# Altium footprint library C210 Rev_D_221221a.PcbLib: 89 footprints (part 2 of 6)
Each footprint in its own frame and in the unit in brackets; x right, y up, seen from the top. Pads: shape width x height; smd on the part's side, far side on the other; paste and mask are expansions set on the pad; w line width, h text height; cw(c..) or ccw(c..) is an arc to the next point about the centre after c.
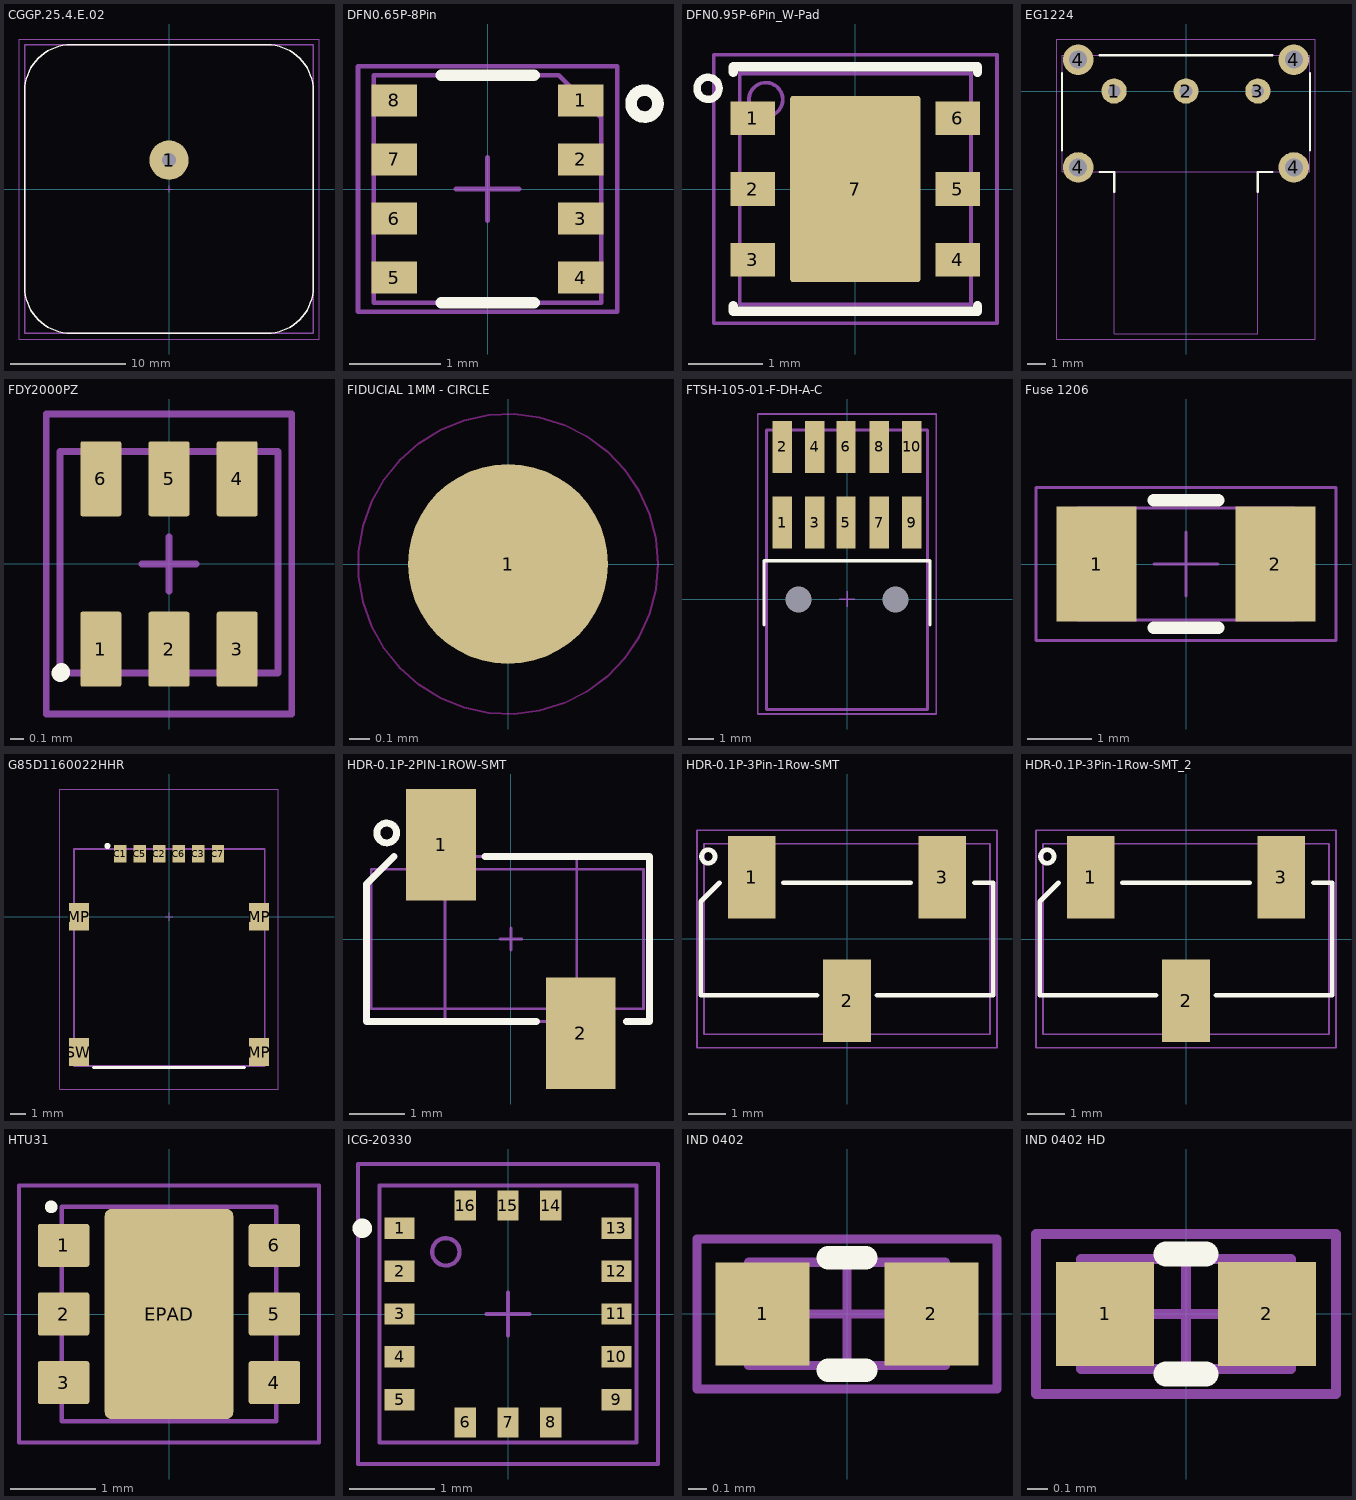
[diagram p1: the footprints below, top view; thin cyan lines are the x and y axes]

## CGGP.25.4.E.02 [mm]
pads (1):
  round 3.4 hole 1.2: 1(0,2.5)
Top Overlay:
  lines w0.127: -12.5,-8.5 ccw(c-8.5,-8.5) -8.5,-12.5 8.5,-12.5 ccw(c8.5,-8.5) 12.5,-8.5 12.5,8.5 ccw(c8.5,8.5) 8.5,12.5 -8.5,12.5 ccw(c-8.5,8.5) -12.5,8.5 -12.5,-8.5
Mechanical 11:
  text ".Designator" at -0.573,4.994 h0.5
Mechanical 13:
  lines w0.127: -12.5,-12.5 12.5,-12.5 12.5,12.5 -12.5,12.5 -12.5,-12.5
Mechanical 15:
  lines w0.05: -0.3,0 0.3,0 ; 0,-0.3 0,0.3
  lines w0.064: -13,-13 13,-13 13,13 -13,13 -13,-13
3D body "CGGP.25.4.E.02.step": height 4.73, standoff -1.47, extent -12.55,-12.55 12.55,12.55

## DFN0.65P-8Pin [mm]
pads (8):
  rect 0.5x0.35 smd: 1(1.025,0.975) 2(1.025,0.325) 3(1.025,-0.325) 4(1.025,-0.975) 5(-1.025,-0.975) 6(-1.025,-0.325) 7(-1.025,0.325) 8(-1.025,0.975)
Top Overlay:
  circle w0.127: c1.727,0.94 r0.148
  lines w0.127: -0.512,-1.25 0.511,-1.25 ; -0.511,1.25 0.512,1.25
Mechanical 11:
  text ".Designator" at -0.838,-0.203 h0.5
Mechanical 13:
  lines w0.05: -1.25,-1.25 -1.25,1.25 0.782,1.25 1.25,0.782 1.25,-1.25 -1.25,-1.25
Mechanical 15:
  lines w0.05: -0.35,0 0.35,0 ; 0,-0.35 0,0.35 ; -1.425,-1.35 1.425,-1.35 1.425,1.35 -1.425,1.35 -1.425,-1.35
3D body: height 1, standoff 0, extent -1.25,-1.25 1.25,1.25

## DFN0.95P-6Pin_W-Pad [mm]
pads (7):
  rect 0.6x0.45 smd mask+0.05: 1(-1.375,0.95) 2(-1.375,0) 3(-1.375,-0.95) 4(1.375,-0.95) 5(1.375,0) 6(1.375,0.95)
  rrect5% 1.75x2.5 smd paste-0.07 mask+0.05: 7(0,0)
Top Overlay:
  circle w0.1: c-1.975,1.35 r0.148
  lines w0.127: -1.639,-1.563 -1.639,-1.639 1.639,-1.639 1.639,-1.563 ; -1.639,1.563 -1.639,1.639 1.639,1.639 1.639,1.563
Mechanical 11:
  text ".Designator" at 0.3,-0.45 h0.5
Mechanical 13:
  circle w0.05: c-1.2,1.2 r0.226
  lines w0.05: -1.55,-1.55 -1.55,1.55 1.55,1.55 1.55,-1.55 -1.55,-1.55
Mechanical 15:
  lines w0.05: -1.9,-1.8 -1.9,1.8 1.9,1.8 1.9,-1.8 -1.9,-1.8
  lines w0.1: -0.5,0 0.5,0 ; 0,-0.5 0,0.5
3D body: height 1, standoff 0, extent -1.55,-1.55 1.55,1.55

## EG1224 [mm]
pads (7):
  round 1.4 hole 0.7: 1(-4,0) 2(0,0) 3(4,0)
  round 1.7 hole 1: 4(-6,-4.25) 4(-6,1.75) 4(6,-4.25) 4(6,1.75)
Top Overlay:
  lines w0.127: -6.9,-3.3 -6.9,1 ; -4.8,-4.5 -4,-4.5 -4,-5.6 ; -4.8,2 4.8,2 ; 4,-5.6 4,-4.5 4.8,-4.5 ; 6.9,-3.3 6.9,1
Mechanical 11:
  text ".Designator" at -0.55,-1.625 h0.5
Mechanical 13:
  lines w0.05: -4,-4.5 -4,-13.5 4,-13.5 4,-4.5 ; -6.9,-4.5 -6.9,2 6.9,2 6.9,-4.5 -6.9,-4.5
Mechanical 15:
  lines w0.05: -7.2,2.9 -7.2,-5.4 -7.2,-13.8 7.2,-13.8 7.2,2.901 -7.199,2.901
3D body: height 8.5, standoff 0, extent -6.9,-4.5 6.9,2
3D body: height 7.5, standoff 3.5, extent -4,-13.5 1,-4.5
3D body: height 0, standoff -3.5, extent -6.4,-4.5 -5.6,-4
3D body: height 0, standoff -3.5, extent -6.4,1.5 -5.6,2
3D body: height 0, standoff -3.5, extent 5.6,1.5 6.4,2
3D body: height 0, standoff -3.5, extent 5.6,-4.5 6.4,-4
3D body: height 0, standoff -3.5, extent -4.25,-0.2 -3.75,0.2
3D body: height 0, standoff -3.5, extent -0.25,-0.2 0.25,0.2
3D body: height 0, standoff -3.5, extent 3.75,-0.2 4.25,0.2

## FDY2000PZ [mm]
pads (6):
  rrect10% 0.3x0.55 smd mask+0.05: 1(-0.5,-0.625) 2(0,-0.625) 3(0.5,-0.625) 4(0.5,0.625) 5(0,0.625) 6(-0.5,0.625)
Top Overlay:
  lines w0.127: -0.8,-0.8 ccw(c-0.798,-0.79) -0.788,-0.79
Mechanical 11:
  text ".Designator" at -0.35,-0.275 h0.5
Mechanical 13:
  lines w0.05: -0.8,-0.8 0.8,-0.8 0.8,0.825 -0.8,0.825 -0.8,-0.8
Mechanical 15:
  lines w0.05: -0.2,0 0.2,0 ; 0,-0.2 0,0.2 ; -0.9,-1.1 0.9,-1.1 0.9,1.1 -0.9,1.1 -0.9,-1.1
3D body "User Library-SOT-563.step": height 0.6, standoff 0.01, extent -0.8,-0.813 0.8,0.813

## FIDUCIAL 1MM - CIRCLE [mm]
pads (1):
  round 1 smd paste-10: 1(0,0)
Top Layer keep-out:
  circle w0.01: c0,0 r0.75
Top Solder:
  circle w0.75: c0,0 r0.375

## FTSH-105-01-F-DH-A-C [mm]
pads (12):
  rect 0.76x2.03 smd: 1(-2.54,3) 2(-2.54,5.96) 3(-1.27,3) 4(-1.27,5.96) 5(-0.04,3) 6(-0.04,5.96) 7(1.27,3) 8(1.27,5.96) 9(2.54,3) 10(2.54,5.96)
  round 0 hole 1.02 unplated: MH1(-1.905,-0.023) MH1(1.905,-0.023)
Top Overlay:
  lines w0.127: -3.25,-1 -3.25,1.5 0,1.5 3.25,1.5 3.25,-1
Mechanical 11:
  text ".Designator" at -0.3,0.342 h0.5
Mechanical 13:
  lines w0.127: -3.15,-4.325 -3.15,6.625 3.15,6.625 3.15,-4.325 -3.15,-4.325
Mechanical 15:
  lines w0.05: -0.3,0 0.3,0 ; 0,-0.3 0,0.3
  lines w0.064: -3.5,-4.5 3.5,-4.5 3.5,7.25 -3.5,7.25 -3.5,-4.5
3D body "FTSH-105-01-F-DH-A-C.stp": height 3.57, standoff -1, extent -3.175,-4.312 3.175,6.584

## Fuse 1206 [mm]
pads (2):
  rect 1.25x1.8 smd: 1(-1.4,0) 2(1.4,0)
Top Overlay:
  lines w0.2: -0.5,-1 0.5,-1 ; -0.5,1 0.5,1
Mechanical 11:
  text ".Designator" at -0.325,-0.275 h0.5
Mechanical 13:
  lines w0.05: -1.7,-0.875 -1.7,0.875 1.7,0.875 1.7,-0.875 -1.7,-0.875
Mechanical 15:
  lines w0.05: -0.5,0 0.5,0 ; 0,-0.5 0,0.5 ; -2.35,-1.2 -2.35,1.2 2.35,1.2 2.35,-1.2 -2.35,-1.2
3D body: height 0.75, standoff 0, extent -1.2,-0.875 1.2,0.875
3D body: height 0.75, standoff 0, extent -1.7,-0.875 -1.2,0.875
3D body: height 0.75, standoff 0, extent 1.2,-0.875 1.7,0.875

## G85D1160022HHR [mm]
pads (10):
  rect 0.8x1.14 smd: C1(-3.17,4.1) C2(-0.63,4.1) C3(1.91,4.1) C5(-1.9,4.1) C6(0.64,4.1) C7(3.18,4.1)
  rect 1.3x1.8 smd: MP(-5.85,0) MP(5.85,-8.8) MP(5.85,0) SW(-5.85,-8.8)
Top Overlay:
  circle w0.2: c-4,4.6 r0.1
  lines w0.2: -4.9,-9.8 4.9,-9.8
Mechanical 11:
  text ".Designator" at -1.27,0 h0.5
Mechanical 13:
  circle w0.2: c-3.17,4.1 r0.1
  lines w0.127: -6.175,-9.7 -6.175,4.4 6.225,4.4 6.225,-9.7 -6.175,-9.7
Mechanical 15:
  lines w0.05: -0.25,0 0.25,0 ; 0,-0.25 0,0.25 ; 0,-0.1 0,0.1 ; -7.1,-11.2 7.1,-11.2 7.1,8.3 -7.1,8.3 -7.1,-11.2
3D body "ig85d1160x22hhr.stp": height 1.44, standoff 0.01, extent -6.175,-9.7 6.225,4.4

## HDR-0.1P-2PIN-1ROW-SMT [mil]
pads (2):
  rect 50x80 smd mask+1.97: 1(-50,67.5) 2(50,-67.5)
Top Overlay:
  circle w5: c-89,76 r7.07
  lines w5: -83.86,59.06 -103.54,39.37 -103.54,-59.06 18.5,-59.06 ; -18.5,59.06 99.41,59.06 99.41,-59.06 82.68,-59.06
Mechanical 11:
  text ".Designator" at -19.68,0 h9.84
Mechanical 13:
  circle w3.94: c-47.24,66.93 r0.98
  lines w1.97: -100,-50 -100,50 95,50 95,-50 -100,-50
Mechanical 15:
  lines w1.97: -7.87,0 7.87,0 ; 0,-7.87 0,7.87 ; -47.24,-59.06 47.24,-59.06 47.24,59.06 -47.24,59.06 -47.24,-59.06
3D body: height 25.2, standoff 0, extent 37,-100 63,0.19
3D body: height 390.94, standoff 0, extent 37,-13 63,13
3D body: height 25.2, standoff 0, extent -63,-0.19 -37,100
3D body: height 390.94, standoff 0, extent -63,-13 -37,13
3D body: height 162.6, standoff 62.6, extent -100,-50 95,50

## HDR-0.1P-3Pin-1Row-SMT [mm]
pads (3):
  rect 1.27x2.2 smd: 1(-2.54,1.65) 2(0,-1.65) 3(2.54,1.65)
Top Overlay:
  circle w0.127: c-3.7,2.2 r0.18
  lines w0.127: -3.4,1.5 -3.9,1 -3.9,-1.5 -0.8,-1.5 ; -1.7,1.5 1.7,1.5 ; 0.8,-1.5 1.95,-1.5 3.9,-1.5 3.9,1.5 3.4,1.5
Mechanical 11:
  text ".Designator" at 0.338,0.279 h0.5
Mechanical 13:
  lines w0.05: -3.81,2.54 3.81,2.54
  lines w0.051: -3.81,2.54 -3.81,-2.54 3.81,-2.54 3.81,2.54
Mechanical 15:
  lines w0.051: -4,-2.9 4,-2.9 4,2.9 -4,2.9 -4,-2.9
3D body: height 0.64, standoff 0, extent -2.87,-0.005 -2.21,2.54
3D body: height 0.64, standoff 0, extent -0.358,-2.545 0.303,0.005
3D body: height 0.64, standoff 0, extent 2.21,-0.005 2.87,2.54
3D body: height 9.93, standoff 0, extent -2.87,-0.33 -2.21,0.33
3D body: height 9.93, standoff 0, extent -0.358,-0.33 0.303,0.33
3D body: height 9.93, standoff 0, extent 2.21,-0.33 2.87,0.33
3D body: height 4.13, standoff 1.59, extent -3.81,-1.27 3.81,1.27

## HDR-0.1P-3Pin-1Row-SMT_2 [mm]
pads (3):
  rect 1.27x2.2 smd: 1(-2.54,1.65) 2(0,-1.65) 3(2.54,1.65)
Top Overlay:
  circle w0.127: c-3.7,2.2 r0.18
  lines w0.127: -3.4,1.5 -3.9,1 -3.9,-1.5 -0.8,-1.5 ; -1.7,1.5 1.7,1.5 ; 0.8,-1.5 1.95,-1.5 3.9,-1.5 3.9,1.5 3.4,1.5
Mechanical 11:
  text ".Designator" at 0.575,0.225 h0.5
Mechanical 13:
  lines w0.05: -3.81,2.54 3.81,2.54
  lines w0.051: -3.81,2.54 -3.81,-2.54 3.81,-2.54 3.81,2.54
Mechanical 15:
  lines w0.051: -4,-2.9 -4,2.9 4,2.9 4,-2.9 -4,-2.9
3D body: height 4.13, standoff 1.59, extent -3.81,-1.27 3.81,1.27
3D body: height 9.93, standoff 0, extent 2.21,-0.33 2.87,0.33
3D body: height 9.93, standoff 0, extent -0.358,-0.33 0.303,0.33
3D body: height 9.93, standoff 0, extent -2.87,-0.33 -2.21,0.33
3D body: height 0.64, standoff 0, extent 2.21,-0.005 2.87,2.54
3D body: height 0.64, standoff 0, extent -0.358,-2.545 0.303,0.005
3D body: height 0.64, standoff 0, extent -2.87,-0.005 -2.21,2.54

## HTU31 [mm]
pads (7):
  rrect10% 0.6x0.5 smd mask+0.05: 1(-1.23,0.8) 2(-1.23,0) 3(-1.23,-0.8) 4(1.23,-0.8) 5(1.23,0) 6(1.23,0.8)
  rrect10% 1.5x2.45 smd mask+0.05: EPAD(0,0)
Top Overlay:
  circle w0.127: c-1.375,1.25 r0.01
Mechanical 11:
  text ".Designator" at -0.5,-0.5 h0.5
Mechanical 13:
  lines w0.05: -1.25,-1.25 1.25,-1.25 1.25,1.25 -1.25,1.25 -1.25,-1.25
Mechanical 15:
  lines w0.05: -0.2,0 0.2,0 ; 0,-0.2 0,0.2 ; -1.75,-1.5 -1.75,1.5 1.75,1.5 1.75,-1.5 -1.75,-1.5
3D body "c-10142048-00-a-3d.stp": height 0.93, standoff 0.01, extent -1.25,-1.25 1.25,1.25

## ICG-20330 [mm]
pads (16):
  rect 0.35x0.25 smd mask+0.05: 1(-1.265,1) 2(-1.265,0.5) 3(-1.265,0) 4(-1.265,-0.5) 5(-1.265,-1) 9(1.265,-1) 10(1.265,-0.5) 11(1.265,0) 12(1.265,0.5) 13(1.265,1)
  rect 0.25x0.35 smd mask+0.05: 6(-0.5,-1.265) 7(0,-1.265) 8(0.5,-1.265) 14(0.5,1.265) 15(0,1.265) 16(-0.5,1.265)
Top Overlay:
  circle w0.127: c-1.7,1 r0.05
Mechanical 11:
  text ".Designator" at -0.825,-0.225 h0.5
Mechanical 13:
  circle w0.05: c-0.725,0.725 r0.16
  lines w0.05: -1.5,-1.5 -1.5,1.5 1.5,1.5 1.5,-1.5 -1.5,-1.5
Mechanical 15:
  lines w0.05: -0.25,0 0.25,0 ; 0,-0.25 0,0.25 ; 0,-0.1 0,0.1 ; -1.75,-1.75 -1.75,1.75 1.75,1.75 1.75,-1.75 -1.75,-1.75
3D body "User Library-LIS331AL.step": height 1.03, standoff 0.01, extent -1.5,-1.5 1.5,1.5

## IND 0402 [mm]
pads (2):
  rect 0.5x0.55 smd: 1(-0.45,0) 2(0.45,0)
Top Overlay:
  lines w0.127: -0.1,-0.3 0.1,-0.3 ; -0.1,0.3 0.1,0.3
Mechanical 11:
  text ".Designator" at 0.45,0.35 h0.5
Mechanical 13:
  lines w0.05: -0.525,-0.275 0.525,-0.275 0.525,0.275 -0.525,0.275 -0.525,-0.275
Mechanical 15:
  lines w0.05: -0.275,0 0.275,0 ; 0,-0.275 0,0.275 ; -0.8,-0.4 0.8,-0.4 0.8,0.4 -0.8,0.4 -0.8,-0.4
3D body: height 0.55, standoff 0, extent -0.275,-0.275 0.275,0.275
3D body: height 0.55, standoff 0, extent -0.525,-0.275 -0.275,0.275
3D body: height 0.55, standoff 0, extent 0.275,-0.275 0.525,0.275

## IND 0402 HD [mm]
pads (2):
  rect 0.49x0.52 smd: 1(-0.405,0) 2(0.405,0)
Top Overlay:
  lines w0.127: -0.1,-0.3 0.1,-0.3 ; -0.1,0.3 0.1,0.3
Mechanical 11:
  text ".Designator" at -0.237,-0.25 h0.5
Mechanical 13:
  lines w0.05: -0.525,-0.275 -0.525,0.275 0.525,0.275 0.525,-0.275 -0.525,-0.275
Mechanical 15:
  lines w0.05: -0.275,0 0.275,0 ; 0,-0.275 0,0.275 ; -0.75,-0.4 -0.75,0.4 0.75,0.4 0.75,-0.4 -0.75,-0.4
3D body: height 0.55, standoff 0, extent 0.275,-0.275 0.525,0.275
3D body: height 0.55, standoff 0, extent -0.525,-0.275 -0.275,0.275
3D body: height 0.55, standoff 0, extent -0.275,-0.275 0.275,0.275